# Altium footprint library Footprint-Lib.PcbLib: 365 footprints (part 4 of 23)
Each footprint in its own frame and in the unit in brackets; x right, y up, seen from the top. Pads: shape width x height; smd on the part's side, far side on the other; paste and mask are expansions set on the pad; w line width, h text height; cw(c..) or ccw(c..) is an arc to the next point about the centre after c.
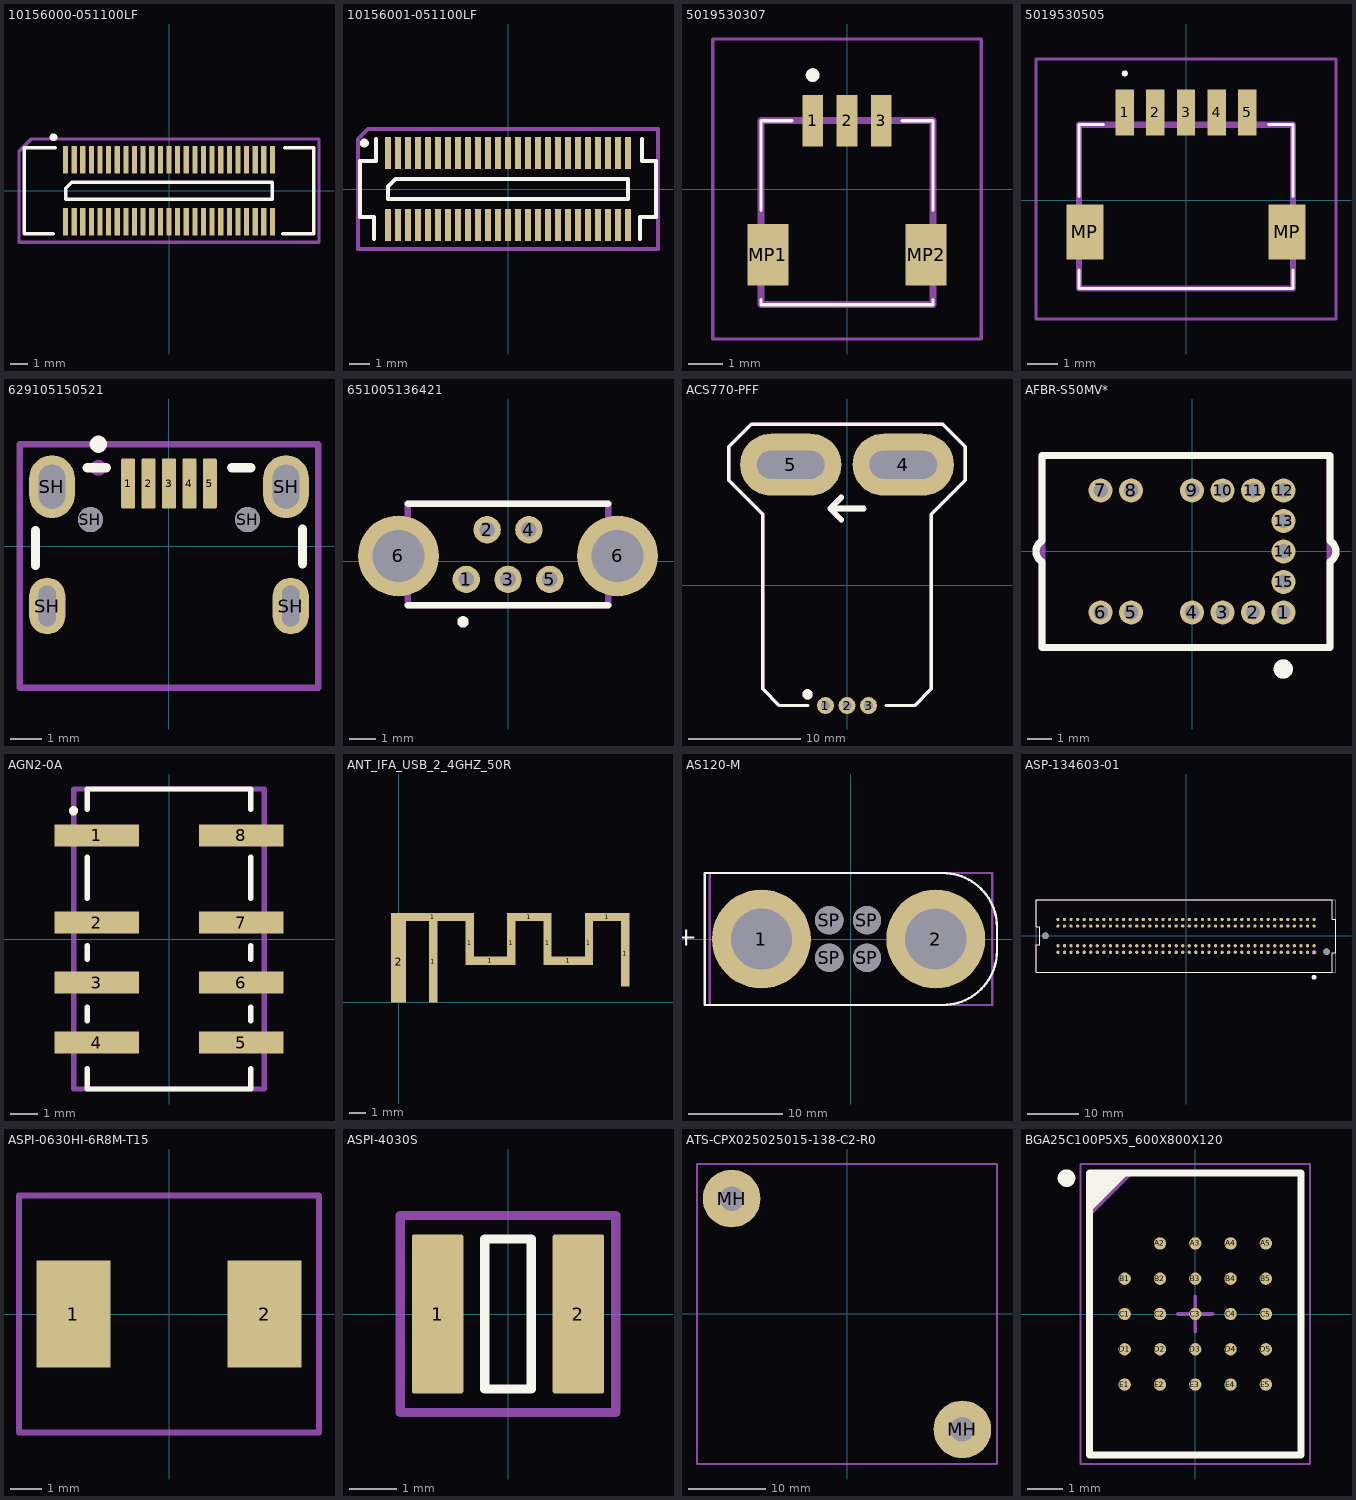
[diagram p3: the footprints below, top view; thin cyan lines are the x and y axes]

## 10156000-051100LF [mm]
pads (50):
  rect 0.3x1.6 smd mask+0.05: 1(-6,1.8) 2(-5.5,1.8) 3(-5,1.8) 4(-4.5,1.8) 5(-4,1.8) 6(-3.5,1.8) 7(-3,1.8) 8(-2.5,1.8) 9(-2,1.8) 10(-1.5,1.8) 11(-1,1.8) 12(-0.5,1.8) 13(0,1.8) 14(0.5,1.8) 15(1,1.8) 16(1.5,1.8) 17(2,1.8) 18(2.5,1.8) 19(3,1.8) 20(3.5,1.8) 21(4,1.8) 22(4.5,1.8) 23(5,1.8) 24(5.5,1.8) 25(6,1.8) 26(6,-1.8) 27(5.5,-1.8) 28(5,-1.8) 29(4.5,-1.8) 30(4,-1.8) 31(3.5,-1.8) 32(3,-1.8) 33(2.5,-1.8) 34(2,-1.8) 35(1.5,-1.8) 36(1,-1.8) 37(0.5,-1.8) 38(0,-1.8) 39(-0.5,-1.8) 40(-1,-1.8) 41(-1.5,-1.8) 42(-2,-1.8) 43(-2.5,-1.8) 44(-3,-1.8) 45(-3.5,-1.8) 46(-4,-1.8) 47(-4.5,-1.8) 48(-5,-1.8) 49(-5.5,-1.8) 50(-6,-1.8)
Top Overlay:
  circle w0.25: c-6.7,3.1 r0.1
  lines w0.2: -6.7,-2.5 -8.4,-2.5 -8.4,2.5 -6.6,2.5 ; 6.6,-2.5 8.4,-2.5 8.4,2.5 6.7,2.5 ; -6,-0.5 6,-0.5 6,0.5 -5.635,0.5 -6,0.135 -6,-0.5
Mechanical 13:
  lines w0.2: -8.7,-3 -8.7,-0.4 -8.7,2.3 -8,3 8.7,3 8.7,-3 -8.7,-3
  text "'.Designator'" at -7.947,-1.41 h0.8
3D body "10156000-051100LF.stp": height 2.76, standoff 0.01, extent -8.15,-2.3 8.15,2.3

## 10156001-051100LF [mm]
pads (50):
  rect 0.3x1.6 smd mask+0.05: 1(-6,1.8) 2(-5.5,1.8) 3(-5,1.8) 4(-4.5,1.8) 5(-4,1.8) 6(-3.5,1.8) 7(-3,1.8) 8(-2.5,1.8) 9(-2,1.8) 10(-1.5,1.8) 11(-1,1.8) 12(-0.5,1.8) 13(0,1.8) 14(0.5,1.8) 15(1,1.8) 16(1.5,1.8) 17(2,1.8) 18(2.5,1.8) 19(3,1.8) 20(3.5,1.8) 21(4,1.8) 22(4.5,1.8) 23(5,1.8) 24(5.5,1.8) 25(6,1.8) 26(6,-1.8) 27(5.5,-1.8) 28(5,-1.8) 29(4.5,-1.8) 30(4,-1.8) 31(3.5,-1.8) 32(3,-1.8) 33(2.5,-1.8) 34(2,-1.8) 35(1.5,-1.8) 36(1,-1.8) 37(0.5,-1.8) 38(0,-1.8) 39(-0.5,-1.8) 40(-1,-1.8) 41(-1.5,-1.8) 42(-2,-1.8) 43(-2.5,-1.8) 44(-3,-1.8) 45(-3.5,-1.8) 46(-4,-1.8) 47(-4.5,-1.8) 48(-5,-1.8) 49(-5.5,-1.8) 50(-6,-1.8)
Top Overlay:
  circle w0.25: c-7.185,2.298 r0.1
  lines w0.2: -6.7,-2.5 -6.7,-1.4 -7.4,-1.4 -7.4,1.4 -6.6,1.4 -6.6,2.5 ; 6.6,-2.5 6.6,-1.4 7.4,-1.4 7.4,1.4 6.7,1.4 6.7,2.5 ; -6,-0.5 -6,0.135 -5.635,0.5 6,0.5 6,-0.5 -6,-0.5
Mechanical 13:
  lines w0.2: -7.5,-3 7.5,-3 7.5,3 -7,3 -7.5,2.5 -7.5,-1 -7.5,-3
  text "'.Designator'" at -7.947,-1.41 h0.8
3D body "10156001-051100LF.stp": height 2.8, standoff 0.01, extent -7.175,-2.3 7.175,2.3

## 5019530307 [mm]
pads (5):
  rect 0.6x1.5 smd: 1(-1,1.987) 2(0,1.987) 3(1,1.987)
  rect 1.2x1.8 smd: MP1(-2.3,-1.913) MP2(2.3,-1.913)
Top Overlay:
  lines w0.1: -2.5,-3.213 -2.5,-3.362 2.5,-3.362 2.5,-3.213 ; -2.5,-0.613 -2.5,1.987 -1.6,1.987 ; 1.6,1.987 2.5,1.987 2.5,-0.613
  lines w0.2: -1.1,3.312 cw(c-1,3.312) -0.9,3.312 cw(c-1,3.312) -1.1,3.312
Mechanical 13:
  lines w0.2: -2.5,-3.362 2.5,-3.362 2.5,1.987 -2.5,1.987 -2.5,-3.362
Mechanical 15:
  lines w0.1: -3.9,-4.362 3.9,-4.362 3.9,4.362 -3.9,4.362 -3.9,-4.362
3D body "501953-0307.stp": height 4.7, standoff 0, extent -2.5,-3.35 2.5,2.55

## 5019530505 [mm]
pads (7):
  rect 0.6x1.5 smd: 1(-2,2.875) 2(-1,2.875) 3(0,2.875) 4(1,2.875) 5(2,2.875)
  rect 1.2x1.8 smd: MP(-3.3,-1.025) MP(3.3,-1.025)
Top Overlay:
  lines w0.1: -3.5,-2.275 -3.5,-2.875 3.5,-2.875 3.5,-2.275 ; -3.5,0.125 -3.5,2.475 -2.7,2.475 ; 2.7,2.475 3.5,2.475 3.5,0.125 ; -2,4.1 ccw(c-2,4.15) -2,4.2 ccw(c-2,4.15) -2,4.1
Mechanical 13:
  lines w0.2: -3.5,-2.875 -3.5,2.475 3.5,2.475 3.5,-2.875 -3.5,-2.875
Mechanical 15:
  lines w0.1: -4.9,-3.875 -4.9,4.625 4.9,4.625 4.9,-3.875 -4.9,-3.875
3D body "501953-0505.stp": height 4.7, standoff 0, extent -3.5,-2.57 3.5,3.33

## 629105150521 [mm]
height 2.35
pads (11):
  rrect25% 0.45x1.6 smd mask+0.12: 1(-1.3,2) 2(-0.65,2) 3(0,2) 4(0.65,2) 5(1.3,2)
  oval 1.15x1.8 hole 0.55 slot 1.3 at 90 deg: SH(-3.875,-1.9) SH(3.875,-1.9)
  oval 1.45x2 hole 0.85 slot 1.4 at 90 deg mask+0.15: SH(-3.725,1.9) SH(3.725,1.9)
  round 0.8 hole 0.8 unplated mask+0.3: SH(-2.5,0.85) SH(2.5,0.85)
Top Overlay:
  circle w0.3: c-2.25,3.25 r0.125
  lines w0.3: -4.25,-0.6 -4.25,0.5 ; -2.6,2.5 -2,2.5 ; 2,2.5 2.6,2.5 ; 4.25,-0.55 4.25,0.55
Mechanical 13:
  circle w0.3: c-2.25,2.5 r0.1
  lines w0.2: -4.75,-4.5 -4.75,3.25 4.75,3.25 4.75,-4.5 -4.75,-4.5
  text ".Designator" at -4.998,-0.333 h1
3D body "629105150521.stp": height 2.78, standoff -1.75, extent -4,-4.3 4,2.303

## 651005136421 [mm]
pads (7):
  round 1.05 hole 0.6: 1(-1.613,-0.685) 2(-0.813,1.215) 3(-0.013,-0.685) 4(0.787,1.215) 5(1.587,-0.685)
  round 3.1 hole 2: 6(-4.213,0.215) 6(4.187,0.215)
Top Overlay:
  circle w0.254: c-1.738,-2.316 r0.093
  lines w0.254: -3.863,-1.685 3.837,-1.685 ; -3.863,2.215 3.837,2.215
Mechanical 13:
  lines w0.254: -3.863,-1.685 -3.863,2.215 3.837,2.215 3.837,-1.685 -3.863,-1.685
3D body "651005136421.stp": height 9.4, standoff -2.8, extent -5.116,-1.685 5.086,2.215

## ACS770-PFF [mm]
pads (5):
  round 1.5 hole 0.8: 1(-1.91,-10.7) 2(0,-10.7) 3(1.91,-10.7)
  oval 9x5.5 hole 2.5 slot 6 at 0 deg: 4(5,10.7) 5(-5,10.7)
Top Overlay:
  circle w0.5: c-3.5,-9.7 r0.203
  lines w0.3: -3.5,-10.7 -6,-10.7 -7.5,-9.2 -7.5,0.8 -7.5,6.3 -10.5,9.3 -10.5,12.3 -8.5,14.3 0,14.3 8.5,14.3 10.5,12.3 10.5,9.3 8.5,7.3 7.5,6.3 7.5,-9.2 6,-10.7 3.5,-10.7
  lines w0.5: -0.5,5.8 -1.5,6.8 ; -0.5,7.8 -1.5,6.8 ; 1.5,6.8 -1.5,6.8
Mechanical 13:
  circle w0.5: c-3.5,-9.7 r0.203
  lines w0.3: -3.5,-10.7 -6,-10.7 -7.5,-9.2 -7.5,0.8 -7.5,6.3 -10.5,9.3 -10.5,12.3 -8.5,14.3 0,14.3 8.5,14.3 10.5,12.3 10.5,9.3 8.5,7.3 7.5,6.3 7.5,-9.2 6,-10.7 3.5,-10.7
  lines w0.5: -0.5,5.8 -1.5,6.8 ; -0.5,7.8 -1.5,6.8 ; 1.5,6.8 -1.5,6.8
  text "'.Designator'" at -6.315,-1.4 h1
3D body "ACS770-PFF.STEP": height 7.01, standoff -3.52, extent -7.002,-11.214 6.998,11.603

## AFBR-S50MV* [mm]
pads (15):
  round 1 hole 0.6: 1(3.81,-2.54) 2(2.54,-2.54) 3(1.27,-2.54) 4(0,-2.54) 5(-2.54,-2.54) 6(-3.81,-2.54) 7(-3.81,2.54) 8(-2.54,2.54) 9(0,2.54) 10(1.27,2.54) 11(2.54,2.54) 12(3.81,2.54) 13(3.81,1.27) 14(3.81,0) 15(3.81,-1.27)
Top Overlay:
  circle w0.5: c3.8,-4.9 r0.15
  lines w0.3: -6.254,-0.43 cw(c-6,0) -6.251,0.432 ; -6.25,-0.5 -6.25,-4 5.75,-4 5.75,-0.435 ccw(c5.747,-0.435) 5.747,-0.432 ccw(c5.496,0) 5.75,0.43 5.75,4 -6.25,4 -6.25,0.5
Mechanical 13:
  circle w0.5: c3.8,-4.9 r0.15
  lines w0.3: -6.25,-4 5.75,-4 5.75,4 -6.25,4 -6.25,-4
  text "'.Designator'" at -5.665,-0.417 h1
3D body "AFBR-S50MV85G.stp": height 7.71, standoff -4.29, extent -6.42,-3.8 5.98,3.8

## AGN2-0A [mm]
pads (8):
  rect 3.1x0.8 smd: 1(-2.65,3.8) 2(-2.65,0.6) 3(-2.65,-1.6) 4(-2.65,-3.8) 5(2.65,-3.8) 6(2.65,-1.6) 7(2.65,0.6) 8(2.65,3.8)
Top Overlay:
  circle w0.3: c-3.5,4.7 r0.021
  lines w0.2: -3,-4.75 -3,-5.5 3,-5.5 3,-4.75 ; -3,-3 -3,-2.5 ; -3,-0.75 -3,-0.25 ; -3,1.5 -3,3 ; -3,4.75 -3,5.5 3,5.5 3,4.75 ; 3,-3 3,-2.5 ; 3,-0.75 3,-0.25 ; 3,1.5 3,3
Mechanical 13:
  circle w0.3: c-2.2,3.8 r0.108
  lines w0.2: -3.5,-5.5 -3.5,5.5 3.5,5.5 3.5,-5.5 -3.5,-5.5
  text ".Designator" at -4.998,-0.333 h1
3D body "agn210a12.step": height 10.04, standoff 0.04, extent -3.7,-5.3 3.7,5.3

## ANT_IFA_USB_2_4GHZ_50R [mm]
pads (12):
  rect 5x0.5 smd paste-2539.97 mask+0.102: 1(2.05,5.15)
  rect 0.5x4.9 smd paste-2539.97 mask+0.102: 1(2.1,2.45)
  rect 0.5x2.64 smd paste-2539.97 mask+0.102: 1(4.3,3.58) 1(6.8,3.58) 1(9,3.58) 1(11.5,3.58)
  rect 2x0.5 smd paste-2539.97 mask+0.102: 1(5.55,2.51) 1(10.25,2.51)
  rect 2.7x0.5 smd paste-2539.97 mask+0.102: 1(7.9,5.15) 1(12.6,5.15)
  rect 0.5x3.94 smd paste-2539.97 mask+0.102: 1(13.7,2.93)
  rect 0.9x4.9 smd paste-2539.97 mask+0.102: 2(0,2.45)

## AS120-M [mm]
pads (6):
  round 10.5 hole 6.5: 1(-9.5,0) 2(9,0)
  round 3 hole 3 unplated: SP(-2.3,-2) SP(-2.3,2) SP(1.7,-2) SP(1.7,2)
Top Overlay:
  lines w0.254: -15.5,-7 -15.5,0 -15.5,7 9.764,7 cw(c9.764,1.264) 15.5,1.264 15.5,-1.264 cw(c9.764,-1.264) 9.764,-7 -15.5,-7
  text "+" at -16.334,1 h2
Mechanical 13:
  lines w0.254: -15,-7 -15,7 15,7 15,-7 -15,-7
  text "'.Designator'" at -5.665,-0.417 h1
  text "+" at -10.5,-1.5 h3
3D body "AS120-M.STEP": height 26, standoff -5, extent -14.975,-6.7 15,6.7

## ASP-134603-01 [mm]
height 6.55
pads (162):
  round 0.64 smd: C1(24.765,-3.175) C2(23.495,-3.175) C3(22.225,-3.175) C4(20.955,-3.175) C5(19.685,-3.175) C6(18.415,-3.175) C7(17.145,-3.175) C8(15.875,-3.175) C9(14.605,-3.175) C10(13.335,-3.175) C11(12.065,-3.175) C12(10.795,-3.175) C13(9.525,-3.175) C14(8.255,-3.175) C15(6.985,-3.175) C16(5.715,-3.175) C17(4.445,-3.175) C18(3.175,-3.175) C19(1.905,-3.175) C20(0.635,-3.175) C21(-0.635,-3.175) C22(-1.905,-3.175) C23(-3.175,-3.175) C24(-4.445,-3.175) C25(-5.715,-3.175) C26(-6.985,-3.175) C27(-8.255,-3.175) C28(-9.525,-3.175) C29(-10.795,-3.175) C30(-12.065,-3.175) C31(-13.335,-3.175) C32(-14.605,-3.175) C33(-15.875,-3.175) C34(-17.145,-3.175) C35(-18.415,-3.175) C36(-19.685,-3.175) C37(-20.955,-3.175) C38(-22.225,-3.175) C39(-23.495,-3.175) C40(-24.765,-3.175) D1(24.765,-1.905) D2(23.495,-1.905) D3(22.225,-1.905) D4(20.955,-1.905) D5(19.685,-1.905) D6(18.415,-1.905) D7(17.145,-1.905) D8(15.875,-1.905) D9(14.605,-1.905) D10(13.335,-1.905) D11(12.065,-1.905) D12(10.795,-1.905) D13(9.525,-1.905) D14(8.255,-1.905) D15(6.985,-1.905) D16(5.715,-1.905) D17(4.445,-1.905) D18(3.175,-1.905) D19(1.905,-1.905) D20(0.635,-1.905) D21(-0.635,-1.905) D22(-1.905,-1.905) D23(-3.175,-1.905) D24(-4.445,-1.905) D25(-5.715,-1.905) D26(-6.985,-1.905) D27(-8.255,-1.905) D28(-9.525,-1.905) D29(-10.795,-1.905) D30(-12.065,-1.905) D31(-13.335,-1.905) D32(-14.605,-1.905) D33(-15.875,-1.905) D34(-17.145,-1.905) D35(-18.415,-1.905) D36(-19.685,-1.905) D37(-20.955,-1.905) D38(-22.225,-1.905) D39(-23.495,-1.905) D40(-24.765,-1.905) G1(24.765,1.905) G2(23.495,1.905) G3(22.225,1.905) G4(20.955,1.905) G5(19.685,1.905) G6(18.415,1.905) G7(17.145,1.905) G8(15.875,1.905) G9(14.605,1.905) G10(13.335,1.905) G11(12.065,1.905) G12(10.795,1.905) G13(9.525,1.905) G14(8.255,1.905) G15(6.985,1.905) G16(5.715,1.905) G17(4.445,1.905) G18(3.175,1.905) G19(1.905,1.905) G20(0.635,1.905) G21(-0.635,1.905) G22(-1.905,1.905) G23(-3.175,1.905) G24(-4.445,1.905) G25(-5.715,1.905) G26(-6.985,1.905) G27(-8.255,1.905) G28(-9.525,1.905) G29(-10.795,1.905) G30(-12.065,1.905) G31(-13.335,1.905) G32(-14.605,1.905) G33(-15.875,1.905) G34(-17.145,1.905) G35(-18.415,1.905) G36(-19.685,1.905) G37(-20.955,1.905) G38(-22.225,1.905) G39(-23.495,1.905) G40(-24.765,1.905) H1(24.765,3.175) H2(23.495,3.175) H3(22.225,3.175) H4(20.955,3.175) H5(19.685,3.175) H6(18.415,3.175) H7(17.145,3.175) H8(15.875,3.175) H9(14.605,3.175) H10(13.335,3.175) H11(12.065,3.175) H12(10.795,3.175) H13(9.525,3.175) H14(8.255,3.175) H15(6.985,3.175) H16(5.715,3.175) H17(4.445,3.175) H18(3.175,3.175) H19(1.905,3.175) H20(0.635,3.175) H21(-0.635,3.175) H22(-1.905,3.175) H23(-3.175,3.175) H24(-4.445,3.175) H25(-5.715,3.175) H26(-6.985,3.175) H27(-8.255,3.175) H28(-9.525,3.175) H29(-10.795,3.175) H30(-12.065,3.175) H31(-13.335,3.175) H32(-14.605,3.175) H33(-15.875,3.175) H34(-17.145,3.175) H35(-18.415,3.175) H36(-19.685,3.175) H37(-20.955,3.175) H38(-22.225,3.175) H39(-23.495,3.175) H40(-24.765,3.175)
  round 1.27 hole 1.27 unplated: MH(-27.18,0) MH(27.18,-3.05)
Top Overlay:
  circle w0.5: c24.75,-8 r0.2
  lines w0.2: -29,-7 -29,-1.75 -28.25,-1.75 -28.25,1.75 -29,1.75 -29,7 0,7 28.25,7 28.25,3.25 29,3.25 29,-3.25 28.25,-3.25 28.25,-7 0,-7 -29,-7
Mechanical 13:
  circle w0.5: c24.765,-3.175 r0.2
  lines w0.2: -29,-7 -29,7 29,7 29,-7 -29,-7
  text "'.Designator'" at -5.665,-0.417 h1
3D body "ASP-134603-01.stp": height 6.57, standoff -1.26, extent -28.727,-6.642 28.727,6.642

## ASPI-0630HI-6R8M-T15 [mm]
pads (2):
  rect 2.35x3.4 smd: 1(-3.025,0) 2(3.025,0)
Mechanical 13:
  lines w0.2: -4.75,-3.75 -4.75,-2 -4.75,3.75 4.75,3.75 4.75,-3.75 -4.75,-3.75
  text "'.Designator'" at -4.682,-0.75 h0.8
3D body "ASPI-0630HI.STEP": height 3.01, standoff 0.01, extent -3.6,-3.325 3.6,3.325

## ASPI-4030S [mm]
pads (2):
  rrect10% 1.1x3.4 smd: 1(-1.5,0) 2(1.5,0)
Top Overlay:
  lines w0.2: -0.5,-1.6 -0.5,1.6 0.5,1.6 0.5,-1.6 -0.5,-1.6
Mechanical 13:
  lines w0.2: -2.3,-2.1 -2.3,2.1 2.3,2.1 2.3,-2.1 0,-2.1 -2.3,-2.1
  text ".Designator" at -4.998,-0.333 h1
3D body "ASPI-4030S.STEP": height 3.01, standoff 0.01, extent -2,-2 2,2

## ATS-CPX025025015-138-C2-R0 [mm]
pads (2):
  round 7.5 hole 3.175: MH(-15,15) MH(15,-15)
Mechanical 13:
  lines w0.2: -19.5,-19.5 -19.5,19.5 19.5,19.5 19.5,-19.5 -19.5,-19.5
  text "'.Designator'" at -5.665,-0.417 h1
3D body "ATS-CPX-138-CX-R0_FUSED.STEP": height 18.5, standoff 3.5, extent -18.996,-18.996 18.996,18.996

## BGA25C100P5X5_600X800X120 [mm] "BGA, 25-Leads, Body 6.00x8.00mmx1.20mm, Pitch 1.00mm"
height 1.2
pads (24):
  round 0.35 smd: A2(-1,2) A3(0,2) A4(1,2) A5(2,2) B1(-2,1) B2(-1,1) B3(0,1) B4(1,1) B5(2,1) C1(-2,0) C2(-1,0) C3(0,0) C4(1,0) C5(2,0) D1(-2,-1) D2(-1,-1) D3(0,-1) D4(1,-1) D5(2,-1) E1(-2,-2) E2(-1,-2) E3(0,-2) E4(1,-2) E5(2,-2)
Top Overlay:
  circle w0.25: c-3.65,3.85 r0.125
  region: -2,4 -3,3 -3,4
  lines w0.2: -3,3 -2,4 ; -3,-4 3,-4 3,4 -3,4 -3,-4
Mechanical 13:
  lines w0.1: -3,-4 -3,2.8 -1.8,4 3,4 3,-4 -3,-4
  text "'.Designator'" at -5.84,-0.925 h1
Mechanical 15:
  lines w0.05: -3.25,-4.25 3.25,-4.25 3.25,4.25 -3.25,4.25 -3.25,-4.25
  lines w0.1: -0.5,0 0.5,0 ; 0,-0.5 0,0.5
3D body "BGA25C100P5X5_600X800X120.step": height 1.2, standoff 0, extent -3,-4 3,4